# Altium footprint library FOOTPRINT.PcbLib: 132 footprints (part 7 of 9)
Each footprint in its own frame and in the unit in brackets; x right, y up, seen from the top. Pads: shape width x height; smd on the part's side, far side on the other; paste and mask are expansions set on the pad; w line width, h text height; cw(c..) or ccw(c..) is an arc to the next point about the centre after c.
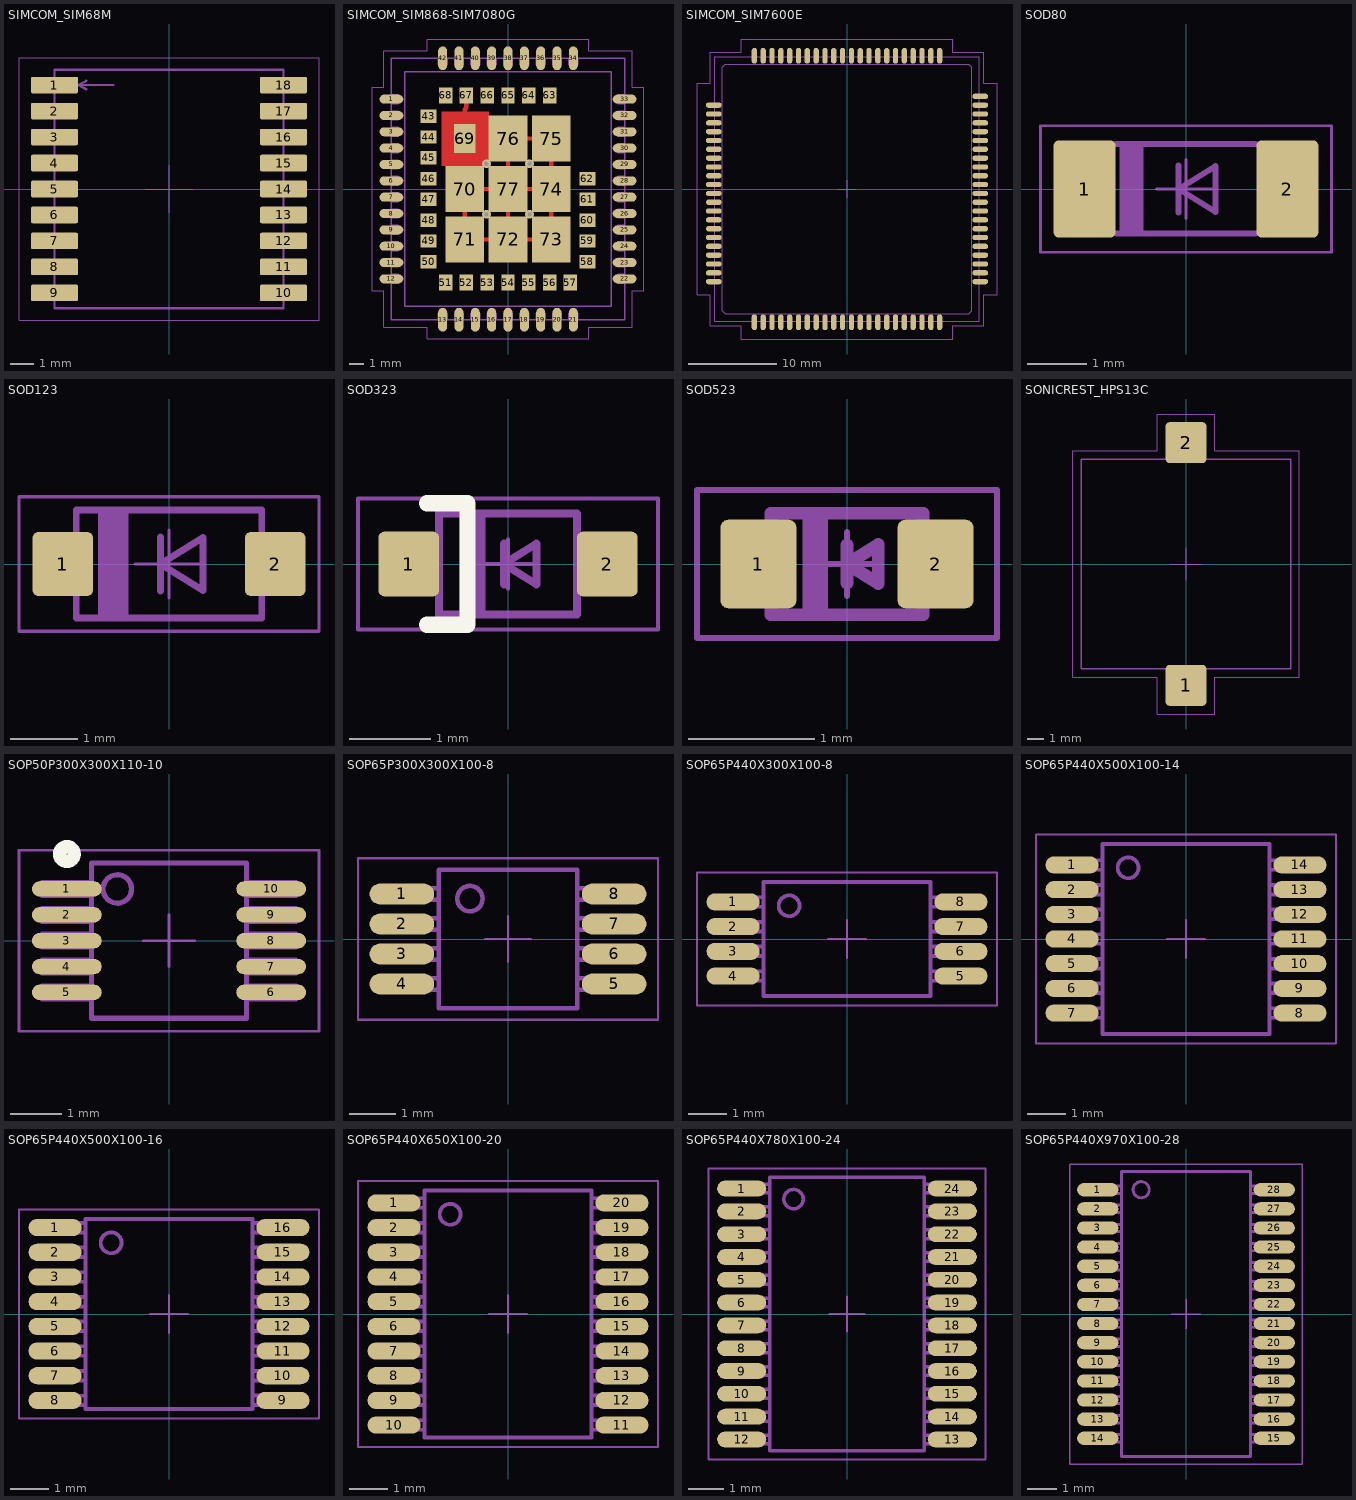
[diagram p6: the footprints below, top view; thin cyan lines are the x and y axes]

## SIMCOM_SIM68M [mm] "GNSS Module, Body 10.1x9.7x2.5mm"
height 2.5
pads (18):
  rrect20% 2x0.7 smd: 1(-4.85,4.4) 2(-4.85,3.3) 3(-4.85,2.2) 4(-4.85,1.1) 5(-4.85,0) 6(-4.85,-1.1) 7(-4.85,-2.2) 8(-4.85,-3.3) 9(-4.85,-4.4) 10(4.85,-4.4) 11(4.85,-3.3) 12(4.85,-2.2) 13(4.85,-1.1) 14(4.85,0) 15(4.85,1.1) 16(4.85,2.2) 17(4.85,3.3) 18(4.85,4.4)
Top Assembly:
  lines w0.1: -3.5,4.225 -3.85,4.4 ; -3.5,4.575 -3.85,4.4 ; -2.35,4.4 -3.85,4.4 ; -4.85,-5.05 -4.85,5.05 4.85,5.05 4.85,-5.05 -4.85,-5.05
  text "1" at -2.125,4.079 h1
Top Courtyard:
  lines w0.05: -6.35,-5.55 -6.35,5.55 6.35,5.55 6.35,-5.55 -6.35,-5.55
Top Component Center:
  lines w0.05: -1,0 1,0 ; 0,-1 0,1
Top Designator:
  text "'.Comment'" at -1.4,-1.06 h0.65
  text "'.Designator'" at -1.4,0.601 h0.65
3D body: height 2.5, standoff 0, extent -4.85,-5.05 4.85,5.05

## SIMCOM_SIM868-SIM7080G [mm]
pads (77):
  oval 1.6x0.6 smd mask+0.05: 1(-7.85,6.05) 2(-7.85,4.95) 3(-7.85,3.85) 4(-7.85,2.75) 5(-7.85,1.65) 6(-7.85,0.55) 7(-7.85,-0.55) 8(-7.85,-1.65) 9(-7.85,-2.75) 10(-7.85,-3.85) 11(-7.85,-4.95) 12(-7.85,-6.05) 22(7.85,-6.05) 23(7.85,-4.95) 24(7.85,-3.85) 25(7.85,-2.75) 26(7.85,-1.65) 27(7.85,-0.55) 28(7.85,0.55) 29(7.85,1.65) 30(7.85,2.75) 31(7.85,3.85) 32(7.85,4.95) 33(7.85,6.05)
  oval 0.6x1.6 smd mask+0.05: 13(-4.4,-8.8) 14(-3.3,-8.8) 15(-2.2,-8.8) 16(-1.1,-8.8) 17(0,-8.8) 18(1.1,-8.8) 19(2.2,-8.8) 20(3.3,-8.8) 21(4.4,-8.8) 34(4.4,8.8) 35(3.3,8.8) 36(2.2,8.8) 37(1.1,8.8) 38(0,8.8) 39(-1.1,8.8) 40(-2.2,8.8) 41(-3.3,8.8) 42(-4.4,8.8)
  rect 1.1x0.9 smd paste-100 mask+0.05: 43(-5.35,4.9) 44(-5.35,3.5) 45(-5.35,2.1) 46(-5.35,0.7) 47(-5.35,-0.7) 48(-5.35,-2.1) 49(-5.35,-3.5) 50(-5.35,-4.9) 58(5.35,-4.9) 59(5.35,-3.5) 60(5.35,-2.1) 61(5.35,-0.7) 62(5.35,0.7)
  rect 0.9x1.1 smd paste-100 mask+0.05: 51(-4.2,-6.3) 52(-2.8,-6.3) 53(-1.4,-6.3) 54(0,-6.3) 55(1.4,-6.3) 56(2.8,-6.3) 57(4.2,-6.3) 63(2.8,6.3) 64(1.4,6.3) 65(0,6.3) 66(-1.4,6.3) 67(-2.8,6.3) 68(-4.2,6.3)
  rect 1.45x1.95 smd paste-100: 69(-2.9,3.4)
  rect 2.6x3.1 smd paste-100 mask+0.05: 70(-2.9,0) 71(-2.9,-3.4) 72(0,-3.4) 73(2.9,-3.4) 74(2.9,0) 75(2.9,3.4) 76(0,3.4) 77(0,0)
via -1.45,-1.7 diameter 0.6 hole 0.3
via 1.45,-1.7 diameter 0.6 hole 0.3
via 1.45,1.7 diameter 0.6 hole 0.3
via -1.45,1.7 diameter 0.6 hole 0.3
Top:
  region: -1.6,1.85 -1.6,4.95 -3.17,4.95 -4.2,3.92 -4.2,1.85
  pour cut-out: -1.3,1.55 -1.3,5.2 -4.45,5.2 -4.45,1.55
  lines w0.3: -2.8,6.3 -2.8,5.475 -2.9,5.375 -2.9,3.4 ; -2.9,0 -2.9,-3.4 0,-3.4 ; -2.9,0 -2.9,3.4 ; -2.9,0 0,0 2.9,0 ; -2.9,3.4 0,3.4 ; 0,-3.4 2.9,-3.4 2.9,0 ; 0,-3.4 0,3.4 ; 0,3.4 2.9,3.4 2.9,0
Top Paste:
  drawing of 140 lines, arcs and shapes, not listed
Top Solder:
  region: -1.55,5 -1.55,1.8 -4.25,1.8 -4.25,3.94 -3.19,5
Top Assembly:
  drawing of 176 lines, arcs and shapes, not listed
Top Courtyard:
  lines w0.05: -9.15,-6.85 -9.15,6.85 -8.35,6.85 -8.35,9.3 -5.45,9.3 -5.45,10.1 5.45,10.1 5.45,9.3 8.35,9.3 8.35,6.85 9.15,6.85 9.15,-6.85 8.35,-6.85 8.35,-9.3 5.45,-9.3 5.45,-10.1 -5.45,-10.1 -5.45,-9.3 -8.35,-9.3 -8.35,-6.85 -9.15,-6.85
Top Component Center:
  lines w0.05: -0.5,0 0.5,0 ; 0,-0.5 0,0.5
Top Designator:
  text "'.Comment'" at 1.06,-1.425 h0.65
  text "'.Designator'" at -0.601,-1.425 h0.65
3D body "User Library-SIM868.x_t": height 2.51, standoff 0.01, extent -7.85,-8.8 7.85,8.8
3D body: height 2.52, standoff 2.5, extent -6.85,-7.8 6.85,7.8

## SIMCOM_SIM7600E [mm]
pads (87):
  oval 1.8x0.6 smd: 1(-15.1,9.5) 2(-15.1,8.5) 3(-15.1,7.5) 4(-15.1,6.5) 5(-15.1,5.5) 6(-15.1,4.5) 7(-15.1,3.5) 8(-15.1,2.5) 9(-15.1,1.5) 10(-15.1,0.5) 11(-15.1,-0.5) 12(-15.1,-1.5) 13(-15.1,-2.5) 14(-15.1,-3.5) 15(-15.1,-4.5) 16(-15.1,-5.5) 17(-15.1,-6.5) 18(-15.1,-7.5) 19(-15.1,-8.5) 20(-15.1,-9.5) 41(15.1,-9.5) 42(15.1,-8.5) 43(15.1,-7.5) 44(15.1,-6.5) 45(15.1,-5.5) 46(15.1,-4.5) 47(15.1,-3.5) 48(15.1,-2.5) 49(15.1,-1.5) 50(15.1,-0.5) 51(15.1,0.5) 52(15.1,1.5) 53(15.1,2.5) 54(15.1,3.5) 55(15.1,4.5) 56(15.1,5.5) 57(15.1,6.5) 58(15.1,7.5) 59(15.1,8.5) 60(15.1,9.5) 81(-15.1,-10.5) 82(15.1,-10.5) 85(15.1,10.5)
  oval 0.6x1.8 smd: 21(-9.5,-15.1) 22(-8.5,-15.1) 23(-7.5,-15.1) 24(-6.5,-15.1) 25(-5.5,-15.1) 26(-4.5,-15.1) 27(-3.5,-15.1) 28(-2.5,-15.1) 29(-1.5,-15.1) 30(-0.5,-15.1) 31(0.5,-15.1) 32(1.5,-15.1) 33(2.5,-15.1) 34(3.5,-15.1) 35(4.5,-15.1) 36(5.5,-15.1) 37(6.5,-15.1) 38(7.5,-15.1) 39(8.5,-15.1) 40(9.5,-15.1) 61(9.5,15.1) 62(8.5,15.1) 63(7.5,15.1) 64(6.5,15.1) 65(5.5,15.1) 66(4.5,15.1) 67(3.5,15.1) 68(2.5,15.1) 69(1.5,15.1) 70(0.5,15.1) 71(-0.5,15.1) 72(-1.5,15.1) 73(-2.5,15.1) 74(-3.5,15.1) 75(-4.5,15.1) 76(-5.5,15.1) 77(-6.5,15.1) 78(-7.5,15.1) 79(-8.5,15.1) 80(-9.5,15.1) 83(10.5,-15.1) 84(-10.5,-15.1) 86(-10.5,15.1) 87(10.5,15.1)
Top Assembly:
  lines w0.1: 13.8,-14.15 14.15,-13.8 14.15,13.8 13.8,14.15 -13.8,14.15 -14.15,13.8 -14.15,-13.8 -13.8,-14.15 13.8,-14.15 ; 13.8,-14.15 13.8,-14.15 ; -15,-15 15,-15 15,15 -15,15 -15,-15
Top Courtyard:
  lines w0.05: -17,-12 -15.5,-12 -15.5,-15.5 -12,-15.5 -12,-17 12,-17 12,-15.5 15.5,-15.5 15.5,-12 17,-12 17,12 15.5,12 15.5,15.5 12,15.5 12,17 -12,17 -12,15.5 -15.5,15.5 -15.5,12 -17,12 -17,-12
Top Component Center:
  lines w0.05: -1,0 1,0 ; 0,-1 0,1
Top Designator:
  text "'.Comment'" at -1.425,-1.06 h0.65
  text "'.Designator'" at -1.425,0.601 h0.65
3D body: height 2.9, standoff 1.2, extent -14.15,-14.15 14.15,14.15
3D body: height 1.2, standoff 0, extent -15,-15 15,15

## SOD80 [mm] "Small Outline Diode, SOD-123, 2-Leads, Body 2.75x1.60mm"
height 1.15
pads (2):
  rrect15% 1.05x1.65 smd: 1(-1.725,0) 2(1.725,0)
Top Assembly:
  region: -1.125,0.762 -1.125,-0.762 -0.729,-0.762 -0.729,0.762
  lines w0.1: -1.397,-0.503 ccw(c-1.143,-0.503) -1.143,-0.757 1.143,-0.757 ccw(c1.143,-0.503) 1.397,-0.503 ; -1.397,0.513 cw(c-1.143,0.513) -1.143,0.767 1.143,0.767 cw(c1.143,0.513) 1.397,0.513 ; -0.125,-0.4 -0.125,0.4 ; -1.778,-0.757 -1.397,-0.757 -1.397,0.767 -1.778,0.767 -1.778,-0.757 ; -0.125,0 0.504,0.393 0.504,-0.393 -0.125,0 ; 1.397,-0.757 1.778,-0.757 1.778,0.767 1.397,0.767 1.397,-0.757
Top Courtyard:
  lines w0.05: -2.475,-1.075 -2.475,1.075 2.475,1.075 2.475,-1.075 -2.475,-1.075
Top Component Center:
  lines w0.05: -0.5,0 0.5,0 ; 0,-0.5 0,0.5
Top Designator:
  text "'.Comment'" at 1.9,-0.56 h0.65
  text "'.Designator'" at 1.9,0.101 h0.65
3D body "LL4148_MED.step": height 1.45, standoff 0.01, extent -1.75,-0.723 1.75,0.724

## SOD123 [mm] "Small Outline Diode, SOD-123, 2-Leads, Body 2.75x1.60mm"
height 1.15
pads (2):
  rrect20% 0.9x0.95 smd: 1(-1.575,0) 2(1.575,0)
Top Assembly:
  rectangle: -1.05,-0.8 -0.6,0.8
  lines w0.1: -1.725,-0.275 -1.725,0.275 ; -1.375,-0.275 -1.925,-0.275 -1.925,0.275 -1.375,0.275 ; -0.125,-0.4 -0.125,0.4 ; 1.375,-0.275 1.925,-0.275 1.925,0.275 1.375,0.275 ; 1.725,-0.275 1.725,0.275 ; -1.375,-0.8 1.375,-0.8 1.375,0.8 -1.375,0.8 -1.375,-0.8 ; -0.125,0 0.504,0.393 0.504,-0.393 -0.125,0
Top Courtyard:
  lines w0.05: -2.225,-1 2.225,-1 2.225,1 -2.225,1 -2.225,-1
Top Component Center:
  lines w0.05: -0.5,0 0.5,0 ; 0,-0.5 0,0.5
Top Designator:
  text "'.Comment'" at 1.975,-0.56 h0.65
  text "'.Designator'" at 1.975,0.101 h0.65
3D body "D_SOD-123.step": height 1.25, standoff 0, extent -1.9,-0.8 1.9,0.8

## SOD323 [mm] "Small Outline Diode, SOD-323, 2-Leads, Body 1.70x1.25mm"
height 1
pads (2):
  rrect20% 0.75x0.8 smd: 1(-1.225,0) 2(1.225,0)
Top Overlay:
  lines w0.2: -1,-0.75 -0.5,-0.75 -0.5,0.75 -1,0.75
Top Assembly:
  rectangle: -0.6,-0.625 -0.275,0.625
  lines w0.1: -1.05,-0.175 -1.05,0.175 ; -0.85,-0.175 -1.2,-0.175 -1.2,0.175 -0.85,0.175 ; -0.05,-0.25 -0.05,0.25 ; 0.85,-0.175 1.2,-0.175 1.2,0.175 0.85,0.175 ; 1.05,-0.175 1.05,0.175 ; -0.85,-0.625 0.85,-0.625 0.85,0.625 -0.85,0.625 -0.85,-0.625 ; -0.05,0 0.35,-0.25 0.35,0.25 -0.05,0
Top Courtyard:
  lines w0.05: -1.85,-0.81 -1.85,0.81 1.85,0.81 1.85,-0.81 -1.85,-0.81
Top Component Center:
  lines w0.05: -0.3,0 0.3,0 ; 0,-0.3 0,0.3
Top Designator:
  text "'.Designator'" at 1.275,0.101 h0.65
  text "'.Comment'" at 1.275,-0.56 h0.65
3D body "D_SOD-323.step": height 1.1, standoff 0, extent -1.25,-0.625 1.25,0.625

## SOD523 [mm] "Small Outline Diode, SOD-523, Flat Leads, 2-Leads, Body 1.20x0.80mm"
height 0.63
pads (2):
  rrect20% 0.6x0.7 smd: 1(-0.7,0) 2(0.7,0)
Top Assembly:
  rectangle: -0.35,-0.4 -0.15,0.4
  lines w0.1: -0.6,-0.15 -0.8,-0.15 -0.8,0.15 -0.6,0.15 ; 0,-0.15 0,0.15 ; 0.6,-0.15 0.8,-0.15 0.8,0.15 0.6,0.15 ; -0.6,-0.4 0.6,-0.4 0.6,0.4 -0.6,0.4 -0.6,-0.4 ; 0,0 0.247,-0.154 0.247,0.154 0,0
Top Courtyard:
  lines w0.05: -1.185,-0.585 1.185,-0.585 1.185,0.585 -1.185,0.585 -1.185,-0.585
Top Component Center:
  lines w0.05: -0.25,0 0.25,0 ; 0,-0.25 0,0.25
Top Designator:
  text "'.Designator'" at 0.95,0.151 h0.65
  text "'.Comment'" at 0.95,-0.485 h0.65
3D body "D_SOD-523.step": height 0.63, standoff 0, extent -0.8,-0.4 0.8,0.4

## SONICREST_HPS13C [mm] "Piezo sound"
height 2.5
pads (2):
  rrect20% 2.5x2.5 smd: 1(0,-7.4) 2(0,7.4)
Top Assembly:
  lines w0.1: -1,-6.4 -6.4,-6.4 -6.4,6.4 -1,6.4 ; -1,-6.4 -1,-8.4 1,-8.4 1,-6.4 ; -1,-6.4 1,-6.4 ; -1,6.4 -1,8.4 1,8.4 1,6.4 ; -1,6.4 1,6.4 ; 1,-6.4 6.4,-6.4 6.4,6.4 1,6.4
Top Courtyard:
  lines w0.05: -6.9,-6.9 -1.75,-6.9 -1.75,-9.15 1.75,-9.15 1.75,-6.9 6.9,-6.9 6.9,6.9 1.75,6.9 1.75,9.15 -1.75,9.15 -1.75,6.9 -6.9,6.9 -6.9,-6.9
Top Component Center:
  lines w0.05: -1,0 1,0 ; 0,-1 0,1
Top Designator:
  text "'.Comment'" at -1.64,-0.5 h0.65
  text "'.Designator'" at -1.64,0.203 h0.65
3D body: height 0.25, standoff 0, extent -1,6.4 1,8.4
3D body: height 0.25, standoff 0, extent -1,-8.4 1,-6.4
3D body: height 2.5, standoff 0, extent -6.4,-6.4 6.4,6.4

## SOP50P300X300X110-10 [mm] "Small Outline Package, 10-pin, 3.0x3.0mm"
height 1.1
pads (10):
  oval 1.35x0.3 smd: 1(-1.975,1) 2(-1.975,0.5) 3(-1.975,0) 4(-1.975,-0.5) 5(-1.975,-1) 6(1.975,-1) 7(1.975,-0.5) 8(1.975,0) 9(1.975,0.5) 10(1.975,1)
Top Overlay:
  circle w0.26: c-1.975,1.675 r0.14
Top Assembly:
  circle w0.1: c-1,1 r0.275
  lines w0.1: -1.5,-1.125 -2.45,-1.125 -2.45,-0.875 -1.5,-0.875 ; -1.5,-0.625 -2.45,-0.625 -2.45,-0.375 -1.5,-0.375 ; -1.5,-0.125 -2.45,-0.125 -2.45,0.125 -1.5,0.125 ; -1.5,0.375 -2.45,0.375 -2.45,0.625 -1.5,0.625 ; -1.5,0.875 -2.45,0.875 -2.45,1.125 -1.5,1.125 ; 1.5,-1.125 2.45,-1.125 2.45,-0.875 1.5,-0.875 ; 1.5,-0.625 2.45,-0.625 2.45,-0.375 1.5,-0.375 ; 1.5,-0.125 2.45,-0.125 2.45,0.125 1.5,0.125 ; 1.5,0.375 2.45,0.375 2.45,0.625 1.5,0.625 ; 1.5,0.875 2.45,0.875 2.45,1.125 1.5,1.125 ; -1.5,-1.5 -1.5,1.5 1.5,1.5 1.5,-1.5 -1.5,-1.5
Top Courtyard:
  lines w0.05: -2.9,-1.75 -2.9,1.75 2.9,1.75 2.9,-1.75 -2.9,-1.75
Top Component Center:
  lines w0.05: -0.5,0 0.5,0 ; 0,-0.5 0,0.5
Top Designator:
  text "'.Comment'" at -1.075,-0.81 h0.65
  text "'.Designator'" at -1.075,0.351 h0.65
3D body "MSOP-10_3x3mm_P0.5mm.step": height 0.95, standoff 0, extent -2.45,-1.5 2.45,1.5

## SOP65P300X300X100-8 [mm] "Small Outline Package, 8-pin, 3.0x3.0mm"
height 1
pads (8):
  oval 1.4x0.45 smd: 1(-2.3,0.975) 2(-2.3,0.325) 3(-2.3,-0.325) 4(-2.3,-0.975) 5(2.3,-0.975) 6(2.3,-0.325) 7(2.3,0.325) 8(2.3,0.975)
Top Assembly:
  circle w0.1: c-0.825,0.875 r0.275
  lines w0.1: -1.5,-1.1 -2.5,-1.1 -2.5,-0.85 -1.5,-0.85 ; -1.5,-0.45 -2.5,-0.45 -2.5,-0.2 -1.5,-0.2 ; -1.5,0.2 -2.5,0.2 -2.5,0.45 -1.5,0.45 ; -1.5,0.85 -2.5,0.85 -2.5,1.1 -1.5,1.1 ; 1.5,-1.1 2.5,-1.1 2.5,-0.85 1.5,-0.85 ; 1.5,-0.45 2.5,-0.45 2.5,-0.2 1.5,-0.2 ; 1.5,0.2 2.5,0.2 2.5,0.45 1.5,0.45 ; 1.5,0.85 2.5,0.85 2.5,1.1 1.5,1.1 ; -1.5,-1.5 1.5,-1.5 1.5,1.5 -1.5,1.5 -1.5,-1.5
Top Courtyard:
  lines w0.05: -3.25,-1.75 3.25,-1.75 3.25,1.75 -3.25,1.75 -3.25,-1.75
Top Component Center:
  lines w0.05: -0.5,0 0.5,0 ; 0,-0.5 0,0.5
Top Designator:
  text "'.Designator'" at -1.425,0.351 h0.65
  text "'.Comment'" at -1.425,-0.81 h0.65
3D body "MSOP-8_3x3mm_P0.65mm.step": height 0.95, standoff 0, extent -2.45,-1.5 2.45,1.5

## SOP65P440X300X100-8 [mm] "Small Outline Package, 8-pin, 4.4x3.0mm"
height 1
pads (8):
  oval 1.4x0.45 smd: 1(-3,0.975) 2(-3,0.325) 3(-3,-0.325) 4(-3,-0.975) 5(3,-0.975) 6(3,-0.325) 7(3,0.325) 8(3,0.975)
Top Assembly:
  circle w0.1: c-1.525,0.875 r0.275
  lines w0.1: -2.2,-1.1 -3.2,-1.1 -3.2,-0.85 -2.2,-0.85 ; -2.2,-0.45 -3.2,-0.45 -3.2,-0.2 -2.2,-0.2 ; -2.2,0.2 -3.2,0.2 -3.2,0.45 -2.2,0.45 ; -2.2,0.85 -3.2,0.85 -3.2,1.1 -2.2,1.1 ; 2.2,-1.1 3.2,-1.1 3.2,-0.85 2.2,-0.85 ; 2.2,-0.45 3.2,-0.45 3.2,-0.2 2.2,-0.2 ; 2.2,0.2 3.2,0.2 3.2,0.45 2.2,0.45 ; 2.2,0.85 3.2,0.85 3.2,1.1 2.2,1.1 ; -2.2,-1.5 2.2,-1.5 2.2,1.5 -2.2,1.5 -2.2,-1.5
Top Courtyard:
  lines w0.05: -3.95,-1.75 3.95,-1.75 3.95,1.75 -3.95,1.75 -3.95,-1.75
Top Component Center:
  lines w0.05: -0.5,0 0.5,0 ; 0,-0.5 0,0.5
Top Designator:
  text "'.Designator'" at -1.425,0.351 h0.65
  text "'.Comment'" at -1.425,-0.81 h0.65
3D body "TSSOP-8_4.4x3mm_P0.65mm.step": height 1.1, standoff 0, extent -3.2,-1.5 3.2,1.5

## SOP65P440X500X100-14 [mm] "Small Outline Package, 14-pin, 4.4x5.0mm"
height 1
pads (14):
  oval 1.4x0.45 smd: 1(-3,1.95) 2(-3,1.3) 3(-3,0.65) 4(-3,0) 5(-3,-0.65) 6(-3,-1.3) 7(-3,-1.95) 8(3,-1.95) 9(3,-1.3) 10(3,-0.65) 11(3,0) 12(3,0.65) 13(3,1.3) 14(3,1.95)
Top Assembly:
  circle w0.1: c-1.525,1.875 r0.275
  lines w0.1: -2.2,-2.075 -3.2,-2.075 -3.2,-1.825 -2.2,-1.825 ; -2.2,-1.425 -3.2,-1.425 -3.2,-1.175 -2.2,-1.175 ; -2.2,-0.775 -3.2,-0.775 -3.2,-0.525 -2.2,-0.525 ; -2.2,-0.125 -3.2,-0.125 -3.2,0.125 -2.2,0.125 ; -2.2,0.525 -3.2,0.525 -3.2,0.775 -2.2,0.775 ; -2.2,1.175 -3.2,1.175 -3.2,1.425 -2.2,1.425 ; 2.2,-2.075 3.2,-2.075 3.2,-1.825 2.2,-1.825 ; 2.2,-1.425 3.2,-1.425 3.2,-1.175 2.2,-1.175 ; 2.2,-0.775 3.2,-0.775 3.2,-0.525 2.2,-0.525 ; 2.2,-0.125 3.2,-0.125 3.2,0.125 2.2,0.125 ; 2.2,0.525 3.2,0.525 3.2,0.775 2.2,0.775 ; 2.2,1.175 3.2,1.175 3.2,1.425 2.2,1.425 ; -2.2,1.825 -2.2,1.825 ; -2.2,1.825 -3.2,1.825 -3.2,2.075 -2.2,2.075 ; -2.2,2.075 -2.2,2.075 ; 2.2,1.825 3.2,1.825 3.2,2.075 2.2,2.075 ; 2.2,1.825 2.2,1.825 ; 2.2,2.075 2.2,2.075 ; -2.2,-2.5 2.2,-2.5 2.2,2.5 -2.2,2.5 -2.2,-2.5
Top Courtyard:
  lines w0.05: -3.95,-2.75 3.95,-2.75 3.95,2.75 -3.95,2.75 -3.95,-2.75
Top Component Center:
  lines w0.05: -0.5,0 0.5,0 ; 0,-0.5 0,0.5
Top Designator:
  text "'.Comment'" at -1.75,-0.66 h0.65
  text "'.Designator'" at -1.75,0.501 h0.65
3D body "TSSOP-14_4.4x5mm_P0.65mm.step": height 1, standoff 0, extent -3.2,-2.5 3.2,2.5

## SOP65P440X500X100-16 [mm] "Small Outline Package, 16-pin, 4.4x5.0mm"
height 1
pads (16):
  oval 1.4x0.45 smd: 1(-3,2.275) 2(-3,1.625) 3(-3,0.975) 4(-3,0.325) 5(-3,-0.325) 6(-3,-0.975) 7(-3,-1.625) 8(-3,-2.275) 9(3,-2.275) 10(3,-1.625) 11(3,-0.975) 12(3,-0.325) 13(3,0.325) 14(3,0.975) 15(3,1.625) 16(3,2.275)
Top Assembly:
  circle w0.1: c-1.525,1.875 r0.275
  lines w0.1: -2.2,-2.4 -3.2,-2.4 -3.2,-2.15 -2.2,-2.15 ; -2.2,-1.75 -3.2,-1.75 -3.2,-1.5 -2.2,-1.5 ; -2.2,-1.1 -3.2,-1.1 -3.2,-0.85 -2.2,-0.85 ; -2.2,-0.45 -3.2,-0.45 -3.2,-0.2 -2.2,-0.2 ; -2.2,0.2 -3.2,0.2 -3.2,0.45 -2.2,0.45 ; -2.2,0.85 -3.2,0.85 -3.2,1.1 -2.2,1.1 ; -2.2,1.5 -3.2,1.5 -3.2,1.75 -2.2,1.75 ; 2.2,-2.4 3.2,-2.4 3.2,-2.15 2.2,-2.15 ; 2.2,-1.75 3.2,-1.75 3.2,-1.5 2.2,-1.5 ; 2.2,-1.1 3.2,-1.1 3.2,-0.85 2.2,-0.85 ; 2.2,-0.45 3.2,-0.45 3.2,-0.2 2.2,-0.2 ; 2.2,0.2 3.2,0.2 3.2,0.45 2.2,0.45 ; 2.2,0.85 3.2,0.85 3.2,1.1 2.2,1.1 ; 2.2,1.5 3.2,1.5 3.2,1.75 2.2,1.75 ; -2.2,2.15 -3.2,2.15 -3.2,2.4 -2.2,2.4 ; -2.2,2.15 -2.2,2.15 ; -2.2,2.4 -2.2,2.4 ; 2.2,2.15 2.2,2.15 ; 2.2,2.15 3.2,2.15 3.2,2.4 2.2,2.4 ; 2.2,2.4 2.2,2.4 ; -2.2,-2.5 -2.2,2.5 2.2,2.5 2.2,-2.5 -2.2,-2.5
Top Courtyard:
  lines w0.05: -3.95,-2.75 -3.95,2.75 3.95,2.75 3.95,-2.75 -3.95,-2.75
Top Component Center:
  lines w0.05: -0.5,0 0.5,0 ; 0,-0.5 0,0.5
Top Designator:
  text "'.Designator'" at -1.975,0.526 h0.65
  text "'.Comment'" at -1.975,-0.635 h0.65
3D body "TSSOP-16_4.4x5mm_P0.65mm.step": height 1.1, standoff 0, extent -3.2,-2.5 3.2,2.5

## SOP65P440X650X100-20 [mm] "Small Outline Package, 20-pin, 4.4x6.5mm"
height 1
pads (20):
  oval 1.4x0.45 smd: 1(-3,2.925) 2(-3,2.275) 3(-3,1.625) 4(-3,0.975) 5(-3,0.325) 6(-3,-0.325) 7(-3,-0.975) 8(-3,-1.625) 9(-3,-2.275) 10(-3,-2.925) 11(3,-2.925) 12(3,-2.275) 13(3,-1.625) 14(3,-0.975) 15(3,-0.325) 16(3,0.325) 17(3,0.975) 18(3,1.625) 19(3,2.275) 20(3,2.925)
Top Assembly:
  circle w0.1: c-1.525,2.625 r0.275
  lines w0.1: -2.2,-2.4 -3.2,-2.4 -3.2,-2.15 -2.2,-2.15 ; -2.2,-1.75 -3.2,-1.75 -3.2,-1.5 -2.2,-1.5 ; -2.2,-1.1 -3.2,-1.1 -3.2,-0.85 -2.2,-0.85 ; -2.2,-0.45 -3.2,-0.45 -3.2,-0.2 -2.2,-0.2 ; -2.2,0.2 -3.2,0.2 -3.2,0.45 -2.2,0.45 ; -2.2,0.85 -3.2,0.85 -3.2,1.1 -2.2,1.1 ; -2.2,1.5 -3.2,1.5 -3.2,1.75 -2.2,1.75 ; 2.2,-2.4 3.2,-2.4 3.2,-2.15 2.2,-2.15 ; 2.2,-1.75 3.2,-1.75 3.2,-1.5 2.2,-1.5 ; 2.2,-1.1 3.2,-1.1 3.2,-0.85 2.2,-0.85 ; 2.2,-0.45 3.2,-0.45 3.2,-0.2 2.2,-0.2 ; 2.2,0.2 3.2,0.2 3.2,0.45 2.2,0.45 ; 2.2,0.85 3.2,0.85 3.2,1.1 2.2,1.1 ; 2.2,1.5 3.2,1.5 3.2,1.75 2.2,1.75 ; -2.2,-3.05 -2.2,-3.05 ; -2.2,-3.05 -3.2,-3.05 -3.2,-2.8 -2.2,-2.8 ; -2.2,-2.8 -2.2,-2.8 ; -2.2,2.15 -3.2,2.15 -3.2,2.4 -2.2,2.4 ; -2.2,2.15 -2.2,2.15 ; -2.2,2.4 -2.2,2.4 ; -2.2,2.8 -2.2,2.8 ; -2.2,2.8 -3.2,2.8 -3.2,3.05 -2.2,3.05 ; -2.2,3.05 -2.2,3.05 ; 2.2,-3.05 2.2,-3.05 ; 2.2,-3.05 3.2,-3.05 3.2,-2.8 2.2,-2.8 ; 2.2,-2.8 2.2,-2.8 ; 2.2,2.15 2.2,2.15 ; 2.2,2.15 3.2,2.15 3.2,2.4 2.2,2.4 ; 2.2,2.4 2.2,2.4 ; 2.2,2.8 2.2,2.8 ; 2.2,2.8 3.2,2.8 3.2,3.05 2.2,3.05 ; 2.2,3.05 2.2,3.05 ; -2.2,-3.25 -2.2,3.25 2.2,3.25 2.2,-3.25 -2.2,-3.25
Top Courtyard:
  lines w0.05: -3.95,-3.5 -3.95,3.5 3.95,3.5 3.95,-3.5 -3.95,-3.5
Top Component Center:
  lines w0.05: -0.5,0 0.5,0 ; 0,-0.5 0,0.5
Top Designator:
  text "'.Designator'" at -1.75,0.526 h0.65
  text "'.Comment'" at -1.75,-0.635 h0.65
3D body "TSSOP-20_4.4x6.5mm_P0.65mm.step": height 1.2, standoff 0, extent -3.2,-3.25 3.2,3.25

## SOP65P440X780X100-24 [mm] "Small Outline Package, 24-pin, 4.4x7.8mm"
height 1
pads (24):
  oval 1.4x0.45 smd: 1(-3,3.575) 2(-3,2.925) 3(-3,2.275) 4(-3,1.625) 5(-3,0.975) 6(-3,0.325) 7(-3,-0.325) 8(-3,-0.975) 9(-3,-1.625) 10(-3,-2.275) 11(-3,-2.925) 12(-3,-3.575) 13(3,-3.575) 14(3,-2.925) 15(3,-2.275) 16(3,-1.625) 17(3,-0.975) 18(3,-0.325) 19(3,0.325) 20(3,0.975) 21(3,1.625) 22(3,2.275) 23(3,2.925) 24(3,3.575)
Top Assembly:
  circle w0.1: c-1.525,3.275 r0.275
  lines w0.1: -2.2,-2.4 -3.2,-2.4 -3.2,-2.15 -2.2,-2.15 ; -2.2,-1.75 -3.2,-1.75 -3.2,-1.5 -2.2,-1.5 ; -2.2,-1.1 -3.2,-1.1 -3.2,-0.85 -2.2,-0.85 ; -2.2,-0.45 -3.2,-0.45 -3.2,-0.2 -2.2,-0.2 ; -2.2,0.2 -3.2,0.2 -3.2,0.45 -2.2,0.45 ; -2.2,0.85 -3.2,0.85 -3.2,1.1 -2.2,1.1 ; -2.2,1.5 -3.2,1.5 -3.2,1.75 -2.2,1.75 ; -2.2,3.45 -2.2,3.45 -3.2,3.45 -3.2,3.7 -2.2,3.7 ; 2.2,-2.4 3.2,-2.4 3.2,-2.15 2.2,-2.15 ; 2.2,-1.75 3.2,-1.75 3.2,-1.5 2.2,-1.5 ; 2.2,-1.1 3.2,-1.1 3.2,-0.85 2.2,-0.85 ; 2.2,-0.45 3.2,-0.45 3.2,-0.2 2.2,-0.2 ; 2.2,0.2 3.2,0.2 3.2,0.45 2.2,0.45 ; 2.2,0.85 3.2,0.85 3.2,1.1 2.2,1.1 ; 2.2,1.5 3.2,1.5 3.2,1.75 2.2,1.75 ; -2.2,-3.7 -3.2,-3.7 -3.2,-3.45 -2.2,-3.45 ; -2.2,-3.7 -2.2,-3.7 ; -2.2,-3.45 -2.2,-3.45 ; -2.2,-3.05 -2.2,-3.05 ; -2.2,-3.05 -3.2,-3.05 -3.2,-2.8 -2.2,-2.8 ; -2.2,-2.8 -2.2,-2.8 ; -2.2,2.15 -2.2,2.15 ; -2.2,2.15 -3.2,2.15 -3.2,2.4 -2.2,2.4 ; -2.2,2.4 -2.2,2.4 ; -2.2,2.8 -3.2,2.8 -3.2,3.05 -2.2,3.05 ; -2.2,2.8 -2.2,2.8 ; -2.2,3.05 -2.2,3.05 ; -2.2,3.7 -2.2,3.7 ; 2.2,-3.7 3.2,-3.7 3.2,-3.45 2.2,-3.45 ; 2.2,-3.7 2.2,-3.7 ; 2.2,-3.45 2.2,-3.45 ; 2.2,-3.05 2.2,-3.05 ; 2.2,-3.05 3.2,-3.05 3.2,-2.8 2.2,-2.8 ; 2.2,-2.8 2.2,-2.8 ; 2.2,2.15 3.2,2.15 3.2,2.4 2.2,2.4 ; 2.2,2.15 2.2,2.15 ; 2.2,2.4 2.2,2.4 ; 2.2,2.8 3.2,2.8 3.2,3.05 2.2,3.05 ; 2.2,2.8 2.2,2.8 ; 2.2,3.05 2.2,3.05 ; 2.2,3.45 2.2,3.45 ; 2.2,3.45 3.2,3.45 3.2,3.7 2.2,3.7 ; 2.2,3.7 2.2,3.7 ; -2.2,-3.9 2.2,-3.9 2.2,3.9 -2.2,3.9 -2.2,-3.9
Top Courtyard:
  lines w0.05: -3.95,-4.15 3.95,-4.15 3.95,4.15 -3.95,4.15 -3.95,-4.15
Top Component Center:
  lines w0.05: -0.5,0 0.5,0 ; 0,-0.5 0,0.5
Top Designator:
  text "'.Comment'" at -1.775,-0.61 h0.65
  text "'.Designator'" at -1.775,0.551 h0.65
3D body "TSSOP-24_4.4x7.8mm_P0.65mm.step": height 0.97, standoff 0, extent -3.2,-3.9 3.2,3.9

## SOP65P440X970X100-28 [mm] "Small Outline Package, 28-pin, 4.4x9.7mm"
height 1
pads (28):
  oval 1.4x0.45 smd: 1(-3,4.225) 2(-3,3.575) 3(-3,2.925) 4(-3,2.275) 5(-3,1.625) 6(-3,0.975) 7(-3,0.325) 8(-3,-0.325) 9(-3,-0.975) 10(-3,-1.625) 11(-3,-2.275) 12(-3,-2.925) 13(-3,-3.575) 14(-3,-4.225) 15(3,-4.225) 16(3,-3.575) 17(3,-2.925) 18(3,-2.275) 19(3,-1.625) 20(3,-0.975) 21(3,-0.325) 22(3,0.325) 23(3,0.975) 24(3,1.625) 25(3,2.275) 26(3,2.925) 27(3,3.575) 28(3,4.225)
Top Assembly:
  circle w0.1: c-1.525,4.225 r0.275
  lines w0.1: -2.2,-4.35 -3.2,-4.35 -3.2,-4.1 -2.2,-4.1 ; -2.2,-2.4 -3.2,-2.4 -3.2,-2.15 -2.2,-2.15 ; -2.2,-1.75 -3.2,-1.75 -3.2,-1.5 -2.2,-1.5 ; -2.2,-1.1 -3.2,-1.1 -3.2,-0.85 -2.2,-0.85 ; -2.2,-0.45 -3.2,-0.45 -3.2,-0.2 -2.2,-0.2 ; -2.2,0.2 -3.2,0.2 -3.2,0.45 -2.2,0.45 ; -2.2,0.85 -3.2,0.85 -3.2,1.1 -2.2,1.1 ; -2.2,1.5 -3.2,1.5 -3.2,1.75 -2.2,1.75 ; -2.2,3.45 -2.2,3.45 -3.2,3.45 -3.2,3.7 -2.2,3.7 ; -2.2,4.1 -3.2,4.1 -3.2,4.35 -2.2,4.35 ; 2.2,-4.35 3.2,-4.35 3.2,-4.1 2.2,-4.1 ; 2.2,-2.4 3.2,-2.4 3.2,-2.15 2.2,-2.15 ; 2.2,-1.75 3.2,-1.75 3.2,-1.5 2.2,-1.5 ; 2.2,-1.1 3.2,-1.1 3.2,-0.85 2.2,-0.85 ; 2.2,-0.45 3.2,-0.45 3.2,-0.2 2.2,-0.2 ; 2.2,0.2 3.2,0.2 3.2,0.45 2.2,0.45 ; 2.2,0.85 3.2,0.85 3.2,1.1 2.2,1.1 ; 2.2,1.5 3.2,1.5 3.2,1.75 2.2,1.75 ; 2.2,4.1 3.2,4.1 3.2,4.35 2.2,4.35 ; -2.2,-3.7 -3.2,-3.7 -3.2,-3.45 -2.2,-3.45 ; -2.2,-3.7 -2.2,-3.7 ; -2.2,-3.45 -2.2,-3.45 ; -2.2,-3.05 -2.2,-3.05 ; -2.2,-3.05 -3.2,-3.05 -3.2,-2.8 -2.2,-2.8 ; -2.2,-2.8 -2.2,-2.8 ; -2.2,2.15 -2.2,2.15 ; -2.2,2.15 -3.2,2.15 -3.2,2.4 -2.2,2.4 ; -2.2,2.4 -2.2,2.4 ; -2.2,2.8 -3.2,2.8 -3.2,3.05 -2.2,3.05 ; -2.2,2.8 -2.2,2.8 ; -2.2,3.05 -2.2,3.05 ; -2.2,3.7 -2.2,3.7 ; 2.2,-3.7 3.2,-3.7 3.2,-3.45 2.2,-3.45 ; 2.2,-3.7 2.2,-3.7 ; 2.2,-3.45 2.2,-3.45 ; 2.2,-3.05 2.2,-3.05 ; 2.2,-3.05 3.2,-3.05 3.2,-2.8 2.2,-2.8 ; 2.2,-2.8 2.2,-2.8 ; 2.2,2.15 3.2,2.15 3.2,2.4 2.2,2.4 ; 2.2,2.15 2.2,2.15 ; 2.2,2.4 2.2,2.4 ; 2.2,2.8 3.2,2.8 3.2,3.05 2.2,3.05 ; 2.2,2.8 2.2,2.8 ; 2.2,3.05 2.2,3.05 ; 2.2,3.45 2.2,3.45 ; 2.2,3.45 3.2,3.45 3.2,3.7 2.2,3.7 ; 2.2,3.7 2.2,3.7 ; -2.2,-4.85 2.2,-4.85 2.2,4.85 -2.2,4.85 -2.2,-4.85
Top Courtyard:
  lines w0.05: -3.95,-5.1 3.95,-5.1 3.95,5.1 -3.95,5.1 -3.95,-5.1
Top Component Center:
  lines w0.05: -0.5,0 0.5,0 ; 0,-0.5 0,0.5
Top Designator:
  text "'.Comment'" at -1.425,-0.71 h0.65
  text "'.Designator'" at -1.425,0.451 h0.65
3D body "TSSOP-28_4.4x9.7mm_P0.65mm.step": height 1.1, standoff 0, extent -3.2,-4.85 3.2,4.85